# Altium footprint library LHAC-4XDSP2XV7-VP5_0226_3.PcbLib: 96 footprints (part 4 of 12)
Each footprint in its own frame and in the unit in brackets; x right, y up, seen from the top. Pads: shape width x height; smd on the part's side, far side on the other; paste and mask are expansions set on the pad; w line width, h text height; cw(c..) or ccw(c..) is an arc to the next point about the centre after c.
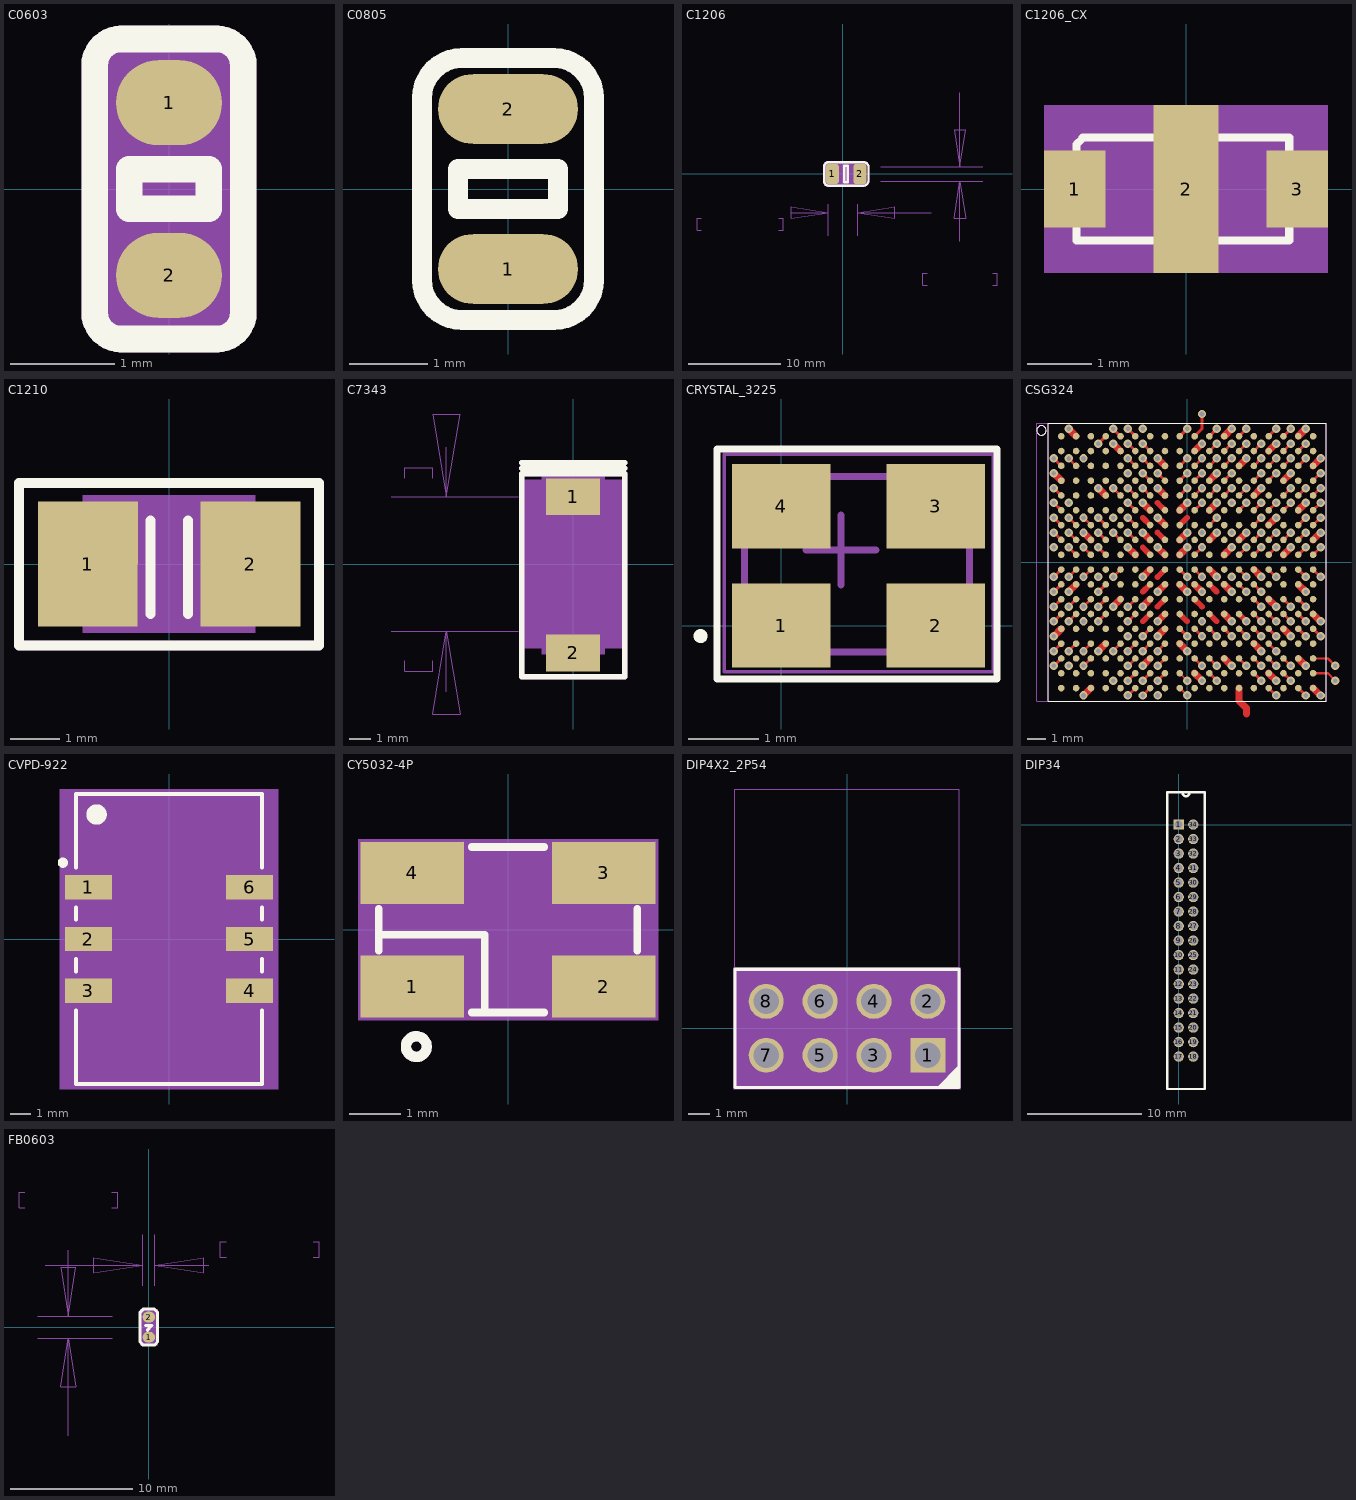
[diagram p3: the footprints below, top view; thin cyan lines are the x and y axes]

## C0603 [mil] "C0603"
pads (2):
  oval 40x32 smd: 1(0,32.5) 2(0,-32.5)
Top Overlay:
  lines w10: -28,-46.5 ccw(c-18,-46.5) -18,-56.5 18,-56.5 ccw(c18,-46.5) 28,-46.5 28,46.5 ccw(c18,46.5) 18,56.5 -18,56.5 ccw(c-18,46.5) -28,46.5 -28,-46.5 ; -15,-7.5 -15,7.5 15,7.5 15,-7.5 -15,-7.5
Mechanical 5:
  lines w10: -28,-46.5 ccw(c-18,-46.5) -18,-56.5 18,-56.5 ccw(c18,-46.5) 28,-46.5 28,46.5 ccw(c18,46.5) 18,56.5 -18,56.5 ccw(c-18,46.5) -28,46.5 -28,-46.5 ; -15,-7.5 15,-7.5 15,7.5 -15,7.5 -15,-7.5
  text "C1779" at -22.45,112.34 h25
Mechanical 14:
  text "1" at 0,43.7 h28
  text "2" at 0,-21.3 h28
Mechanical 16:
  pour cut-out: 28,56.5 28,-56.5 -28,-56.5 -28,56.5
  region: -17.13,-33.46 17.13,-33.46 17.13,33.46 -17.13,33.46
  lines w1: -17.13,-33.46 -17.13,33.46 17.13,33.46 17.13,-33.46 -17.13,-33.46
Mechanical 17:
  text ".Designator" at 0,60 h36
3D body: height 150, standoff 0, extent -17.13,-33.46 17.13,33.46

## C0805 [mil] "C0805"
pads (2):
  oval 70x35 smd: 1(0,-40) 2(0,40)
Top Overlay:
  lines w10: -43,-45.5 ccw(c-23,-45.5) -23,-65.5 23,-65.5 ccw(c23,-45.5) 43,-45.5 43,45.5 ccw(c23,45.5) 23,65.5 -23,65.5 ccw(c-23,45.5) -43,45.5 -43,-45.5 ; -25,-10 -25,10 25,10 25,-10 -25,-10

## C1206 [mil] "C1206"
pads (2):
  rrect36% 55x85 smd: 1(-45.28,0) 2(72.84,0)
Top Overlay:
  lines w9.84: 60.78,-50.5 86.19,-50.5 ccw(c86.19,-27.4) 109.29,-27.4 109.29,29.55 ccw(c88.34,29.55) 88.34,50.5 60.78,50.5
  lines w10: 60.78,-50.5 -60.78,-50.5 cw(c-60.78,-30.5) -80.78,-30.5 -80.78,30.5 cw(c-60.78,30.5) -60.78,50.5 60.78,50.5 ; 5.44,-35 21.18,-35 21.18,35 5.44,35 5.44,-35
Mechanical 5:
  lines w9.84: 60.78,-50.5 86.19,-50.5 ccw(c86.2,-27.4) 97.72,-47.42 ; 60.78,50.5 88.34,50.5 cw(c88.34,29.55) 99.28,47.42 ; 105.26,-40.45 ccw(c86.19,-27.41) 109.29,-27.4 109.29,29.55 ccw(c88.34,29.55) 105.26,41.91
  lines w10: -77.78,-41.04 cw(c-60.78,-30.5) -80.78,-30.5 -80.78,30.5 cw(c-60.78,30.5) -77.78,41.04 ; -71.32,-47.5 ccw(c-60.78,-30.5) -60.78,-50.5 60.78,-50.5 ; -71.32,47.5 cw(c-60.78,30.5) -60.78,50.5 60.78,50.5 ; 5.44,-35 5.44,35 21.18,35 21.18,-35 5.44,-35
  text "C1152" at 102.5,17.5 h25
Mechanical 13:
  lines w1: -605.45,-240 -624.44,-240 -624.44,-190 -605.45,-190 ; -274.56,-240 -255.57,-240 -255.57,-190 -274.56,-190 ; -218.07,-165 -62.99,-165 ; -62.99,-263.43 -62.99,-129.93 ; 62.99,-263.43 62.99,-129.93 ; 161.42,-31.5 598.43,-31.5 ; 161.42,31.5 598.43,31.5 ; 360.04,-475 341.05,-475 341.05,-425 360.04,-425 ; 377.95,-165 62.99,-165 ; 500,-287.5 500,-31.5 ; 500,346.46 500,31.5 ; 639.95,-475 658.94,-475 658.94,-425 639.95,-425 ; -62.99,-165 -220.47,-189.6 -220.47,-140.4 -62.99,-165 ; 62.99,-165 220.47,-140.4 220.47,-189.6 62.99,-165 ; 500,-31.5 524.6,-188.98 475.4,-188.98 500,-31.5 ; 500,31.5 475.4,188.98 524.6,188.98 500,31.5
  text "63.00" at 379.04,-475 h50
  text "1.6" at 430.02,-375 h50
  text "125.98" at -586.45,-240 h50
  text "3.2" at -509.98,-140 h50
Mechanical 14:
  text "1" at -55.28,0 h25
  text "2" at 62.84,0 h25
Mechanical 16:
  pour cut-out: -80.78,-50.5 100,-50.5 100,50.5 -80.78,50.5
  lines w1: -62.99,-31.5 62.99,-31.5 ; -62.99,-31.5 -62.99,31.5 ; -62.99,-31.5 62.99,-31.5 ; -62.99,-31.5 -62.99,31.5 ; -62.99,31.5 62.99,31.5 ; -62.99,31.5 62.99,31.5 ; 62.99,-31.5 62.99,31.5 ; 62.99,-31.5 62.99,31.5
Mechanical 17:
  text ".Designator" at -100.01,16.67 h50

## C1206_CX [mil] "C1206_CX"
pads (3):
  rect 37.4x47.2 smd: 1(-67.91,0) 3(67.91,0)
  rect 39.4x102.4 smd: 2(0,0)
Top Overlay:
  lines w4.92: -63,31 -66.93,27.07 -66.93,-31.5 62.99,-31.5 62.99,31.5 -62.99,31.5
  text ".Designator" at 44.96,-57.34 h25
Mechanical 5:
  lines w4.92: -66.93,-26.06 -66.93,-31.5 -22.15,-31.5 ; -66.93,26.06 -66.93,27.07 -63,31 ; -62.99,31.5 -22.15,31.5 ; 22.15,-31.5 62.99,-31.5 62.99,-26.06 ; 22.15,31.5 62.99,31.5 62.99,26.06
  text "B43" at -25.04,-57.34 h25
Mechanical 14:
  text "2" at -50,-20 h25
  text "1" at -117.91,-20 h25
  text "3" at 17.91,-20 h25
Mechanical 16:
  region: -86.61,-51.2 86.61,-51.2 86.61,51.2 -86.61,51.2
3D body: height 150, standoff 0, extent -86.61,-51.2 86.61,51.2

## C1210 [mil] "C1210"
pads (2):
  rect 80x100 smd: 1(-65,0) 2(65,0)
Top Overlay:
  lines w8: -15,-40 -15,35 ; 15,-40 15,35 ; -120,-65 120,-65 120,65 -120,65 -120,-65
Mechanical 5:
  lines w8: -15,-40 -15,35 ; 15,-40 15,35 ; -120,-65 120,-65 120,65 -120,65 -120,-65
  text "CD1" at 27.51,-82.5 h25
  text "CAP_POL_C1210_100UF" at -100,100 h63
Mechanical 14:
  text "2" at 97,0 h80
  text "1" at -33,0 h80
Mechanical 16:
  region: -69,-55 69,-55 69,55 -69,55
3D body: height 150, standoff 0, extent -69,-55 69,55

## C7343 [mil] "C7343"
pads (2):
  rect 98x67 smd: 1(0,121.98) 2(0,-161.35)
Top Overlay:
  lines w9.84: -93.58,-163.48 -93.58,-204.06 93.58,-204.06 93.58,-163.48
  lines w10: -93.58,-163.48 -93.58,163.48 ; -93.58,173.48 93.58,173.48 ; -93.58,183.48 93.58,183.48 ; 93.58,-163.48 93.58,163.48 ; -93.58,163.48 93.58,163.48 ; -93.58,163.48 93.58,163.48
Mechanical 5:
  lines w9.84: -93.58,-163.48 -93.58,-204.06 93.58,-204.06 93.58,-163.48
  lines w10: -93.58,-163.48 -93.58,163.48 ; -93.58,173.48 93.58,173.48 ; -93.58,183.48 93.58,183.48 ; 93.58,-163.48 93.58,163.48 ; -93.58,163.48 93.58,163.48 ; -93.58,163.48 93.58,163.48
  text "CT1" at -30,209.48 h25
Mechanical 13:
  lines w1: -330,-121.98 -100,-121.98 ; -330,121.98 -100,121.98 ; -305,-175.5 -305,-194.5 -255,-194.5 -255,-175.5 ; -305,155.5 -305,174.5 -255,174.5 -255,155.5 ; -230,-232 -230,-121.98 ; -230,212 -230,121.98 ; -230,-121.98 -205,-271.98 -255,-271.98 -230,-121.98 ; -230,121.98 -255,271.98 -205,271.98 -230,121.98
  text "243.97" at -305,136.5 h25
  text "6.2" at -205,60 h25
Mechanical 14:
  text "1" at -10,121.98 h25
  text "2" at -10,-161.35 h25
Mechanical 16:
  pour cut-out: 57,163.48 57,152.64 93.58,152.64 93.58,-152.64 57,-152.64 57,-163.48 -57,-163.48 -57,-152.64 -93.58,-152.64 -93.58,152.64 -57,152.64 -57,163.48
  region: -88.58,147.64 -88.58,-147.64 88.58,-147.64 88.58,147.64
  lines w1: -88.58,-147.64 -88.58,147.64 88.58,147.64 88.58,-147.64 -88.58,-147.64
Mechanical 17:
  text ".Designator" at -30,-16.67 h25
3D body: height 150, standoff 0, extent -88.58,-147.64 88.58,147.64

## CRYSTAL_3225 [mm]
pads (4):
  rect 1.4x1.2 smd: 1(0,0) 2(2.2,0) 3(2.2,1.7) 4(0,1.7)
Top Overlay:
  circle w0.1: c-1.15,-0.15 r0.05
  lines w0.1: -0.914,-0.762 -0.914,2.515 3.073,2.515 3.073,-0.762 -0.914,-0.762
Mechanical 13:
  lines w0.1: -0.521,-0.379 2.679,-0.379 2.679,2.121 -0.521,2.121 -0.521,-0.379
Mechanical 15:
  lines w0.05: -0.813,-0.66 3.023,-0.66 3.023,2.438 -0.813,2.438 -0.813,-0.66
  lines w0.1: 0.35,1.075 1.35,1.075 ; 0.85,0.575 0.85,1.575
3D body: height 0.7, standoff 0.1, extent -0.508,-0.412 2.692,2.088

## CSG324 [mil] "CSG324"
pads (324):
  round 14 smd: A1(-267.72,267.72) A2(-236.22,267.72) A3(-204.72,267.72) A4(-173.23,267.72) A5(-141.73,267.72) A6(-110.24,267.72) A7(-78.74,267.72) A8(-47.24,267.72) A9(-15.75,267.72) A10(15.75,267.72) A11(47.24,267.72) A12(78.74,267.72) A13(110.24,267.72) A14(141.73,267.72) A15(173.23,267.72) A16(204.72,267.72) A17(236.22,267.72) A18(267.72,267.72) B1(-267.72,236.22) B2(-236.22,236.22) B3(-204.72,236.22) B4(-173.23,236.22) B5(-141.73,236.22) B6(-110.24,236.22) B7(-78.74,236.22) B8(-47.24,236.22) B9(-15.75,236.22) B10(15.75,236.22) B11(47.24,236.22) B12(78.74,236.22) B13(110.24,236.22) B14(141.73,236.22) B15(173.23,236.22) B16(204.72,236.22) B17(236.22,236.22) B18(267.72,236.22) C1(-267.72,204.72) C2(-236.22,204.72) C3(-204.72,204.72) C4(-173.23,204.72) C5(-141.73,204.72) C6(-110.24,204.72) C7(-78.74,204.72) C8(-47.24,204.72) C9(-15.75,204.72) C10(15.75,204.72) C11(47.24,204.72) C12(78.74,204.72) C13(110.24,204.72) C14(141.73,204.72) C15(173.23,204.72) C16(204.72,204.72) C17(236.22,204.72) C18(267.72,204.72) D1(-267.72,173.23) D2(-236.22,173.23) D3(-204.72,173.23) D4(-173.23,173.23) D5(-141.73,173.23) D6(-110.24,173.23) D7(-78.74,173.23) D8(-47.24,173.23) D9(-15.75,173.23) D10(15.75,173.23) D11(47.24,173.23) D12(78.74,173.23) D13(110.24,173.23) D14(141.73,173.23) D15(173.23,173.23) D16(204.72,173.23) D17(236.22,173.23) D18(267.72,173.23) E1(-267.72,141.73) E2(-236.22,141.73) E3(-204.72,141.73) E4(-173.23,141.73) E5(-141.73,141.73) E6(-110.24,141.73) E7(-78.74,141.73) E8(-47.24,141.73) E9(-15.75,141.73) E10(15.75,141.73) E11(47.24,141.73) E12(78.74,141.73) E13(110.24,141.73) E14(141.73,141.73) E15(173.23,141.73) E16(204.72,141.73) E17(236.22,141.73) E18(267.72,141.73) F1(-267.72,110.24) F2(-236.22,110.24) F3(-204.72,110.24) F4(-173.23,110.24) F5(-141.73,110.24) F6(-110.24,110.24) F7(-78.74,110.24) F8(-47.24,110.24) F9(-15.75,110.24) F10(15.75,110.24) F11(47.24,110.24) F12(78.74,110.24) F13(110.24,110.24) F14(141.73,110.24) F15(173.23,110.24) F16(204.72,110.24) F17(236.22,110.24) F18(267.72,110.24) G1(-267.72,78.74) G2(-236.22,78.74) G3(-204.72,78.74) G4(-173.23,78.74) G5(-141.73,78.74) G6(-110.24,78.74) G7(-78.74,78.74) G8(-47.24,78.74) G9(-15.75,78.74) G10(15.75,78.74) G11(47.24,78.74) G12(78.74,78.74) G13(110.24,78.74) G14(141.73,78.74) G15(173.23,78.74) G16(204.72,78.74) G17(236.22,78.74) G18(267.72,78.74) H1(-267.72,47.24) H2(-236.22,47.24) H3(-204.72,47.24) H4(-173.23,47.24) H5(-141.73,47.24) H6(-110.24,47.24) H7(-78.74,47.24) H8(-47.24,47.24) H9(-15.75,47.24) H10(15.75,47.24) H11(47.24,47.24) H12(78.74,47.24) H13(110.24,47.24) H14(141.73,47.24) H15(173.23,47.24) H16(204.72,47.24) H17(236.22,47.24) H18(267.72,47.24) J1(-267.72,15.75) J2(-236.22,15.75) J3(-204.72,15.75) J4(-173.23,15.75) J5(-141.73,15.75) J6(-110.24,15.75) J7(-78.74,15.75) J8(-47.24,15.75) J9(-15.75,15.75) J10(15.75,15.75) J11(47.24,15.75) J12(78.74,15.75) J13(110.24,15.75) J14(141.73,15.75) J15(173.23,15.75) J16(204.72,15.75) J17(236.22,15.75) J18(267.72,15.75) K1(-267.72,-15.75) K2(-236.22,-15.75) K3(-204.72,-15.75) K4(-173.23,-15.75) K5(-141.73,-15.75) K6(-110.24,-15.75) K7(-78.74,-15.75) K8(-47.24,-15.75) K9(-15.75,-15.75) K10(15.75,-15.75) K11(47.24,-15.75) K12(78.74,-15.75) K13(110.24,-15.75) K14(141.73,-15.75) K15(173.23,-15.75) K16(204.72,-15.75) K17(236.22,-15.75) K18(267.72,-15.75) L1(-267.72,-47.24) L2(-236.22,-47.24) L3(-204.72,-47.24) L4(-173.23,-47.24) L5(-141.73,-47.24) L6(-110.24,-47.24) L7(-78.74,-47.24) L8(-47.24,-47.24) L9(-15.75,-47.24) L10(15.75,-47.24) L11(47.24,-47.24) L12(78.74,-47.24) L13(110.24,-47.24) L14(141.73,-47.24) L15(173.23,-47.24) L16(204.72,-47.24) L17(236.22,-47.24) L18(267.72,-47.24) M1(-267.72,-78.74) M2(-236.22,-78.74) M3(-204.72,-78.74) M4(-173.23,-78.74) M5(-141.73,-78.74) M6(-110.24,-78.74) M7(-78.74,-78.74) M8(-47.24,-78.74) M9(-15.75,-78.74) M10(15.75,-78.74) M11(47.24,-78.74) M12(78.74,-78.74) M13(110.24,-78.74) M14(141.73,-78.74) M15(173.23,-78.74) M16(204.72,-78.74) M17(236.22,-78.74) M18(267.72,-78.74) N1(-267.72,-110.24) N2(-236.22,-110.24) N3(-204.72,-110.24) N4(-173.23,-110.24) N5(-141.73,-110.24) N6(-110.24,-110.24) N7(-78.74,-110.24) N8(-47.24,-110.24) N9(-15.75,-110.24) N10(15.75,-110.24) N11(47.24,-110.24) N12(78.74,-110.24) N13(110.24,-110.24) N14(141.73,-110.24) N15(173.23,-110.24) N16(204.72,-110.24) N17(236.22,-110.24) N18(267.72,-110.24) P1(-267.72,-141.73) P2(-236.22,-141.73) P3(-204.72,-141.73) P4(-173.23,-141.73) P5(-141.73,-141.73) P6(-110.24,-141.73) P7(-78.74,-141.73) P8(-47.24,-141.73) P9(-15.75,-141.73) P10(15.75,-141.73) P11(47.24,-141.73) P12(78.74,-141.73) P13(110.24,-141.73) P14(141.73,-141.73) P15(173.23,-141.73) P16(204.72,-141.73) P17(236.22,-141.73) P18(267.72,-141.73) R1(-267.72,-173.23) R2(-236.22,-173.23) R3(-204.72,-173.23) R4(-173.23,-173.23) R5(-141.73,-173.23) R6(-110.24,-173.23) R7(-78.74,-173.23) R8(-47.24,-173.23) R9(-15.75,-173.23) R10(15.75,-173.23) R11(47.24,-173.23) R12(78.74,-173.23) R13(110.24,-173.23) R14(141.73,-173.23) R15(173.23,-173.23) R16(204.72,-173.23) R17(236.22,-173.23) R18(267.72,-173.23) T1(-267.72,-204.72) T2(-236.22,-204.72) T3(-204.72,-204.72) T4(-173.23,-204.72) T5(-141.73,-204.72) T6(-110.24,-204.72) T7(-78.74,-204.72) T8(-47.24,-204.72) T9(-15.75,-204.72) T10(15.75,-204.72) T11(47.24,-204.72) T12(78.74,-204.72) T13(110.24,-204.72) T14(141.73,-204.72) T15(173.23,-204.72) T16(204.72,-204.72) T17(236.22,-204.72) T18(267.72,-204.72) U1(-267.72,-236.22) U2(-236.22,-236.22) U3(-204.72,-236.22) U4(-173.23,-236.22) U5(-141.73,-236.22) U6(-110.24,-236.22) U7(-78.74,-236.22) U8(-47.24,-236.22) U9(-15.75,-236.22) U10(15.75,-236.22) U11(47.24,-236.22) U12(78.74,-236.22) U13(110.24,-236.22) U14(141.73,-236.22) U15(173.23,-236.22) U16(204.72,-236.22) U17(236.22,-236.22) U18(267.72,-236.22) V1(-267.72,-267.72) V2(-236.22,-267.72) V3(-204.72,-267.72) V4(-173.23,-267.72) V5(-141.73,-267.72) V6(-110.24,-267.72) V7(-78.74,-267.72) V8(-47.24,-267.72) V9(-15.75,-267.72) V10(15.75,-267.72) V11(47.24,-267.72) V12(78.74,-267.72) V13(110.24,-267.72) V14(141.73,-267.72) V15(173.23,-267.72) V16(204.72,-267.72) V17(236.22,-267.72) V18(267.72,-267.72)
via 157.47,251.96 diameter 18 hole 10
via 157.47,220.46 diameter 18 hole 10
via -251.96,-220.46 diameter 18 hole 10
via -157.47,-251.96 diameter 18 hole 10
via -157.47,94.48 diameter 18 hole 10
via -283.46,31.49 diameter 18 hole 10
via -188.97,-31.49 diameter 18 hole 10
via -220.46,-125.98 diameter 18 hole 10
via -125.98,-157.47 diameter 18 hole 10
via -251.96,125.98 diameter 18 hole 10
via -220.46,220.46 diameter 18 hole 10
via -125.98,188.97 diameter 18 hole 10
via -62.98,-283.46 diameter 18 hole 10
via 31.49,62.98 diameter 18 hole 10
via 94.48,62.98 diameter 18 hole 10
via 94.48,-31.49 diameter 18 hole 10
via 94.48,125.98 diameter 18 hole 10
via -94.49,283.47 diameter 18 hole 10
via -94.49,251.97 diameter 18 hole 10
via -188.97,251.97 diameter 18 hole 10
via 31.49,-31.49 diameter 18 hole 10
via 31.49,31.49 diameter 18 hole 10
via -0.01,-157.47 diameter 18 hole 10
via -94.48,-157.47 diameter 18 hole 10
via -283.46,220.46 diameter 18 hole 10
via -283.46,157.47 diameter 18 hole 10
via -251.96,-188.97 diameter 18 hole 10
via -157.47,-188.97 diameter 18 hole 10
via -283.46,-188.97 diameter 18 hole 10
via -125.98,-220.46 diameter 18 hole 10
via -0.01,-31.49 diameter 18 hole 10
via -283.47,94.49 diameter 18 hole 10
via -125.98,94.48 diameter 18 hole 10
via -251.96,31.49 diameter 18 hole 10
via -220.46,-188.97 diameter 18 hole 10
via -0.01,-283.46 diameter 18 hole 10
via -157.47,62.98 diameter 18 hole 10
via -125.98,-188.97 diameter 18 hole 10
via -125.98,125.98 diameter 18 hole 10
via -125.98,-125.98 diameter 18 hole 10
via -0.01,220.46 diameter 18 hole 10
via -220.46,31.49 diameter 18 hole 10
via -94.49,-251.97 diameter 18 hole 10
via -283.46,62.98 diameter 18 hole 10
via -0.01,157.47 diameter 18 hole 10
via -251.97,94.49 diameter 18 hole 10
via 157.47,-94.48 diameter 18 hole 10
via -283.46,125.98 diameter 18 hole 10
via 157.47,-62.98 diameter 18 hole 10
via -188.97,-125.98 diameter 18 hole 10
via 283.46,-31.49 diameter 18 hole 10
via 251.96,-31.49 diameter 18 hole 10
via 125.98,-62.98 diameter 18 hole 10
via 62.98,-157.47 diameter 18 hole 10
via -220.46,94.48 diameter 18 hole 10
via 125.98,-157.47 diameter 18 hole 10
via -62.98,-220.46 diameter 18 hole 10
via 94.48,-157.47 diameter 18 hole 10
via -62.98,-188.97 diameter 18 hole 10
via 94.48,157.47 diameter 18 hole 10
via -94.49,-283.47 diameter 18 hole 10
via 62.98,157.47 diameter 18 hole 10
via -188.97,94.48 diameter 18 hole 10
via 125.98,157.47 diameter 18 hole 10
via -125.98,-251.96 diameter 18 hole 10
via 31.49,157.47 diameter 18 hole 10
via -62.98,-251.96 diameter 18 hole 10
via -125.98,62.98 diameter 18 hole 10
via -188.97,-94.48 diameter 18 hole 10
via -220.46,-220.46 diameter 18 hole 10
via -125.98,-94.48 diameter 18 hole 10
via -251.96,220.46 diameter 18 hole 10
via -188.97,31.49 diameter 18 hole 10
via -0.01,-251.96 diameter 18 hole 10
via -251.96,62.98 diameter 18 hole 10
via -125.98,-283.46 diameter 18 hole 10
via -188.97,62.98 diameter 18 hole 10
via -283.46,-220.46 diameter 18 hole 10
via -0.01,188.97 diameter 18 hole 10
via -251.96,-31.49 diameter 18 hole 10
via 62.98,94.48 diameter 18 hole 10
via 31.49,125.98 diameter 18 hole 10
via 31.49,-157.47 diameter 18 hole 10
via 157.47,31.49 diameter 18 hole 10
via 251.97,251.97 diameter 18 hole 10
via 188.97,-31.49 diameter 18 hole 10
via 283.46,157.47 diameter 18 hole 10
via 125.98,-31.49 diameter 18 hole 10
via 125.98,31.49 diameter 18 hole 10
via 220.46,157.47 diameter 18 hole 10
via 283.46,125.98 diameter 18 hole 10
via 188.97,188.97 diameter 18 hole 10
via 251.96,31.49 diameter 18 hole 10
via 251.96,220.46 diameter 18 hole 10
via 283.46,188.97 diameter 18 hole 10
via 251.96,157.47 diameter 18 hole 10
via 188.97,31.49 diameter 18 hole 10
via 251.96,62.98 diameter 18 hole 10
via 283.46,31.49 diameter 18 hole 10
via 188.97,62.98 diameter 18 hole 10
via 125.98,251.96 diameter 18 hole 10
via 283.47,94.49 diameter 18 hole 10
via 157.47,94.48 diameter 18 hole 10
via -157.47,-31.49 diameter 18 hole 10
via 94.48,188.97 diameter 18 hole 10
via 220.46,-125.98 diameter 18 hole 10
via 188.97,-125.98 diameter 18 hole 10
via 251.97,-94.49 diameter 18 hole 10
via 220.46,-94.48 diameter 18 hole 10
via 283.46,-157.47 diameter 18 hole 10
via 251.96,-125.98 diameter 18 hole 10
via 157.47,-157.47 diameter 18 hole 10
via 125.98,125.98 diameter 18 hole 10
via 125.98,283.46 diameter 18 hole 10
via 157.47,125.98 diameter 18 hole 10
via 62.98,283.46 diameter 18 hole 10
via -188.97,-62.98 diameter 18 hole 10
via -251.97,-94.49 diameter 18 hole 10
via 31.49,314.95 diameter 18 hole 10
via 62.98,220.46 diameter 18 hole 10
via 31.49,220.46 diameter 18 hole 10
via -0.01,283.46 diameter 18 hole 10
via 31.49,188.97 diameter 18 hole 10
via 157.47,188.97 diameter 18 hole 10
via -251.96,-125.98 diameter 18 hole 10
via -220.46,-94.48 diameter 18 hole 10
via -283.46,-125.98 diameter 18 hole 10
via 220.46,125.98 diameter 18 hole 10
via 220.46,62.98 diameter 18 hole 10
via 220.46,220.46 diameter 18 hole 10
via 251.97,94.49 diameter 18 hole 10
via 94.49,251.97 diameter 18 hole 10
via 220.46,283.46 diameter 18 hole 10
via 188.97,283.46 diameter 18 hole 10
via 157.47,-125.98 diameter 18 hole 10
via 314.95,-220.46 diameter 18 hole 10
via -94.48,157.47 diameter 18 hole 10
via 220.46,-251.96 diameter 18 hole 10
via 62.98,-251.96 diameter 18 hole 10
via 31.49,-220.46 diameter 18 hole 10
via 62.98,-220.46 diameter 18 hole 10
via -220.46,-31.49 diameter 18 hole 10
via 125.98,-220.46 diameter 18 hole 10
via 157.47,-251.96 diameter 18 hole 10
via -283.47,-94.49 diameter 18 hole 10
via -283.46,-62.98 diameter 18 hole 10
via -62.98,188.97 diameter 18 hole 10
via -283.46,-31.49 diameter 18 hole 10
via -125.98,283.46 diameter 18 hole 10
via -94.48,220.46 diameter 18 hole 10
via 157.47,-220.46 diameter 18 hole 10
via 251.96,-157.47 diameter 18 hole 10
via 188.97,-188.97 diameter 18 hole 10
via 188.97,-157.47 diameter 18 hole 10
via 188.97,-283.46 diameter 18 hole 10
via 220.46,-220.46 diameter 18 hole 10
via 188.97,-220.46 diameter 18 hole 10
via 314.96,-251.97 diameter 18 hole 10
via 251.97,-283.47 diameter 18 hole 10
via 157.47,62.98 diameter 18 hole 10
via 94.48,220.46 diameter 18 hole 10
via -157.47,157.47 diameter 18 hole 10
via 188.97,125.98 diameter 18 hole 10
via -94.48,-188.97 diameter 18 hole 10
via 188.97,220.46 diameter 18 hole 10
via 62.98,251.96 diameter 18 hole 10
via 220.46,251.96 diameter 18 hole 10
via -94.48,188.97 diameter 18 hole 10
via -157.47,283.46 diameter 18 hole 10
via -125.98,251.96 diameter 18 hole 10
via -125.98,220.46 diameter 18 hole 10
via -125.98,157.47 diameter 18 hole 10
via -0.01,-188.97 diameter 18 hole 10
via 94.48,-220.46 diameter 18 hole 10
via 188.97,-251.96 diameter 18 hole 10
via 283.47,-283.47 diameter 18 hole 10
via -62.98,-157.47 diameter 18 hole 10
via 251.96,-62.98 diameter 18 hole 10
via 220.46,-157.47 diameter 18 hole 10
via 157.47,-31.49 diameter 18 hole 10
via 283.46,62.98 diameter 18 hole 10
via 188.97,94.48 diameter 18 hole 10
via 125.98,-125.98 diameter 18 hole 10
via 125.98,220.46 diameter 18 hole 10
via 220.46,188.97 diameter 18 hole 10
via 251.97,283.47 diameter 18 hole 10
via 31.49,251.96 diameter 18 hole 10
via 31.49,-251.96 diameter 18 hole 10
via -220.46,-283.46 diameter 18 hole 10
via -220.46,62.98 diameter 18 hole 10
via -94.48,62.98 diameter 18 hole 10
via -125.98,31.49 diameter 18 hole 10
via -0.01,31.49 diameter 18 hole 10
via -62.98,31.49 diameter 18 hole 10
via -94.48,-31.49 diameter 18 hole 10
via -251.96,-62.98 diameter 18 hole 10
via -157.47,-94.48 diameter 18 hole 10
via -283.46,-157.47 diameter 18 hole 10
via 31.49,-62.98 diameter 18 hole 10
via 31.49,-125.98 diameter 18 hole 10
via -0.01,-62.98 diameter 18 hole 10
via -62.98,-62.98 diameter 18 hole 10
via -62.98,-125.98 diameter 18 hole 10
via -94.49,-94.49 diameter 18 hole 10
via -94.48,-220.46 diameter 18 hole 10
via -188.97,-188.97 diameter 18 hole 10
via -0.01,62.98 diameter 18 hole 10